# Altium footprint library PcbLib1.PcbLib: 49 footprints (part 4 of 4)
Each footprint in its own frame and in the unit in brackets; x right, y up, seen from the top. Pads: shape width x height; smd on the part's side, far side on the other; paste and mask are expansions set on the pad; w line width, h text height; cw(c..) or ccw(c..) is an arc to the next point about the centre after c.
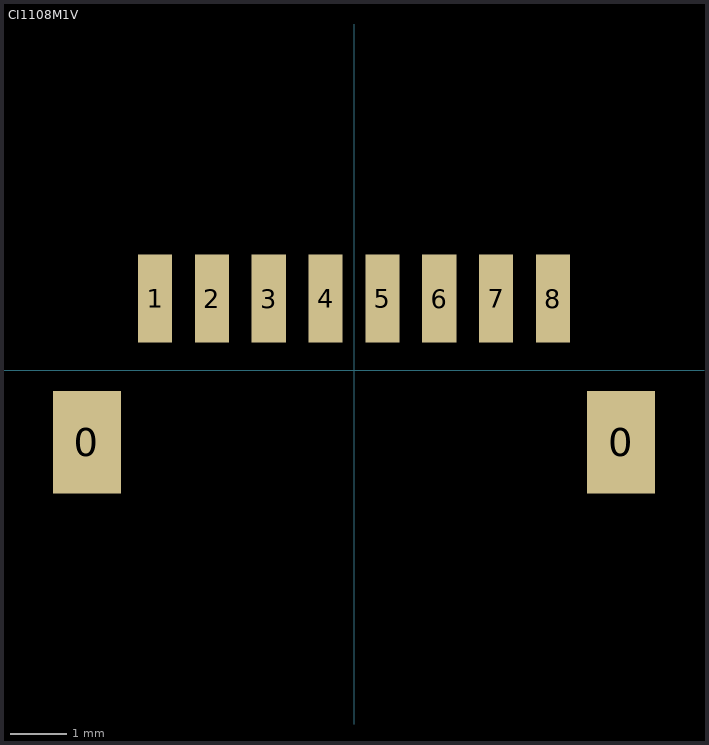
[diagram p3: the footprint, top view; thin cyan lines are the x and y axes]

## СI1108М1V [mm] "8pin"
pads (10):
  rect 1.2x1.8 smd: 0(-4.7,-1.262) 0(4.7,-1.262)
  rect 0.6x1.55 smd: 1(-3.5,1.262) 2(-2.5,1.262) 3(-1.5,1.262) 4(-0.5,1.262) 5(0.5,1.262) 6(1.5,1.262) 7(2.5,1.262) 8(3.5,1.262)
3D body: height 4.25, standoff 0, extent -5,-1.862 5,1.038